# Altium footprint library Chestin_PcbLib.PcbLib: 203 footprints (part 7 of 13)
Each footprint in its own frame and in the unit in brackets; x right, y up, seen from the top. Pads: shape width x height; smd on the part's side, far side on the other; paste and mask are expansions set on the pad; w line width, h text height; cw(c..) or ccw(c..) is an arc to the next point about the centre after c.
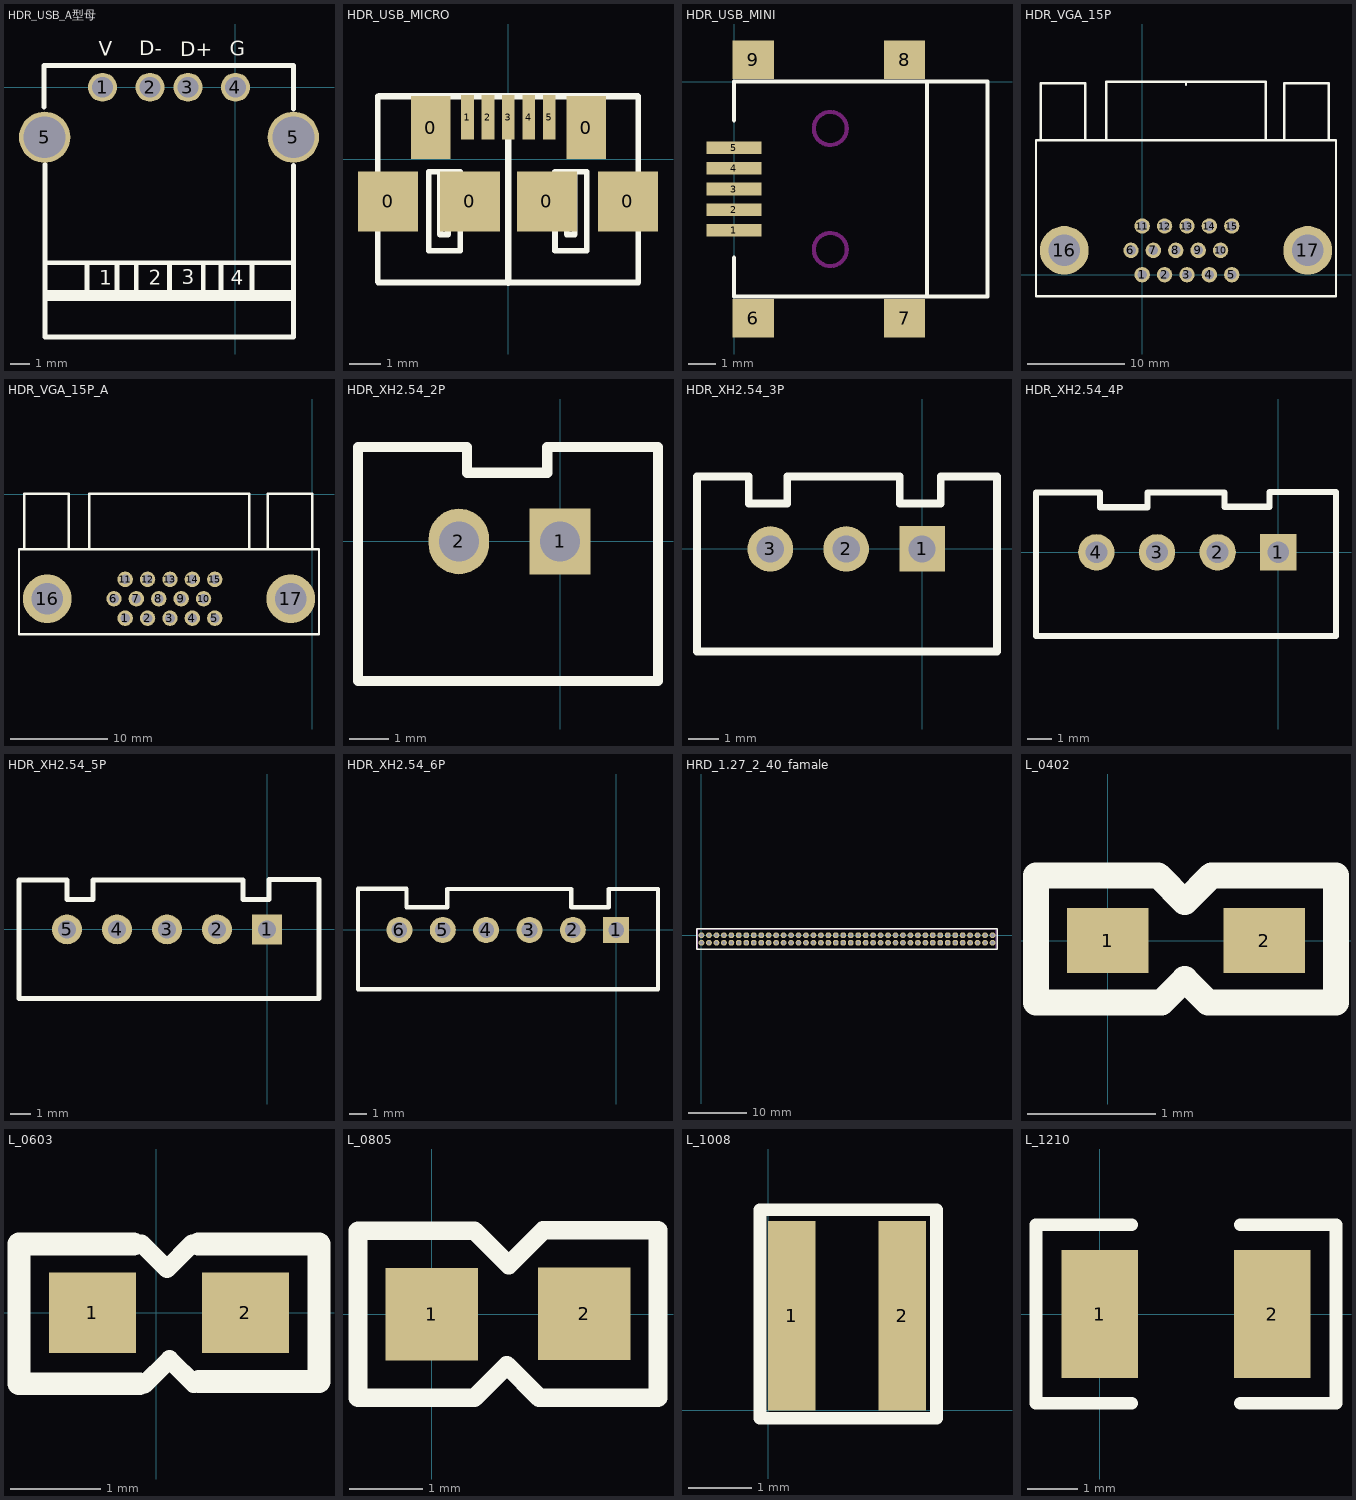
[diagram p6: the footprints below, top view; thin cyan lines are the x and y axes]

## HDR_USB_A型母 [mm]
pads (6):
  round 1.524 hole 1.1: 1(-7,0) 2(-4.5,0) 3(-2.5,0) 4(0,0)
  round 2.7 hole 2.2: 5(-10.05,-2.635) 5(3.05,-2.635)
Top Overlay:
  lines w0.254: -10.079,-1.041 -10.079,1.143 3.053,1.143 3.053,-1.143 3.053,0.356 ; -10.028,-9.246 3.053,-9.246 ; -10.028,-4.064 -10.028,-13.157 3.053,-13.157 3.053,-4.115 ; -10.002,-11.135 3.053,-11.135 ; -10.002,-10.922 3.053,-10.922 ; -9.875,-10.795 3.053,-10.795 ; -7.818,-10.795 -7.818,-9.246 ; -6.243,-10.795 -6.243,-9.322 ; -5.227,-10.82 -5.227,-9.271 ; -3.475,-10.795 -3.475,-9.322 ; -1.697,-10.897 -1.697,-9.271 ; -0.757,-10.871 -0.757,-9.271 ; 0.869,-10.998 0.869,-9.296
  text "V" at -7.188,1.651 h0.76
  text "G" at -0.305,1.651 h0.76
  text "1" at -7.163,-10.414 h0.76
  text "2" at -4.572,-10.414 h0.76
  text "3" at -2.819,-10.389 h0.76
  text "4" at -0.254,-10.414 h0.76
  text "D+" at -2.896,1.626 h0.76
  text "D-" at -5.08,1.676 h0.76
3D body "Samtec-USBR-A-S-S-O-TH.STEP": height 1.9, standoff -8.95, extent -11.202,-12.979 4.598,1.181

## HDR_USB_MICRO [mm]
pads (11):
  rect 1.9x1.9 smd: 0(-3.797,-1.333) 0(-1.206,-1.333) 0(1.232,-1.333) 0(3.797,-1.333)
  rect 1.25x2 smd: 0(-2.451,1.003) 0(2.476,1.003)
  rect 0.4x1.4 smd: 1(-1.283,1.333) 2(-0.635,1.333) 3(0.013,1.333) 4(0.66,1.333) 5(1.308,1.333)
Top Overlay:
  lines w0.178: -4.127,-3.873 -4.127,1.994 ; -4.102,-3.899 4.102,-3.899 ; -2.152,-0.394 -2.152,-2.379 -1.949,-2.379 -1.898,-2.379 -1.898,-0.394 ; 1.861,-0.394 1.861,-2.379 2.115,-2.379 2.115,-0.394 ; 4.127,-3.899 4.127,1.994 ; -2.513,-2.894 -2.513,-0.394 -1.513,-0.394 -1.513,-2.894 -2.513,-2.894 ; 1.487,-2.894 2.487,-2.894 2.487,-0.394 1.487,-0.394 1.487,-2.894
  lines w0.2: -4.077,1.994 4.102,1.994 ; 0.013,-3.91 0.013,1.968
3D body "MICRO USB.STEP": height 2.77, standoff -0.17, extent -4.1,-3.912 4.1,2.018

## HDR_USB_MINI [mm]
pads (9):
  rect 2x0.457 smd: 1(-0.014,-5.389) 2(-0.014,-4.639) 3(-0.014,-3.889) 4(-0.014,-3.139) 5(-0.014,-2.389)
  rect 1.5x1.4 smd: 6(0.686,-8.589) 7(6.186,-8.589) 8(6.186,0.811) 9(0.686,0.811)
Top Overlay:
  lines w0.15: -0.014,-6.389 -0.014,-7.789 6.586,-7.789 9.2,-7.789 9.2,0.011 6.586,0.011 -0.014,0.011 -0.014,-1.389 ; 7,-7.789 7,0.011
Keep-Out Layer:
  circle w0.15: c3.486,-1.689 r0.6
  circle w0.15: c3.486,-6.089 r0.6

## HDR_VGA_15P [mm]
pads (17):
  round 1.58 hole 1: 1(0,0) 2(2.3,0) 3(4.6,0) 4(6.9,0) 5(9.2,0) 6(-1.15,2.5) 7(1.15,2.5) 8(3.45,2.5) 9(5.75,2.5) 10(8.05,2.5) 11(0,5) 12(2.3,5) 13(4.6,5) 14(6.9,5) 15(9.2,5)
  round 5 hole 3.25: 16(-8,2.5) 17(17,2.5)
Top Overlay:
  lines w0.254: -10.9,-2.2 -10.9,13.8 19.9,13.8 19.9,-2.2 -10.89,-2.2 -10.9,-2.19 ; -10.4,13.8 -10.4,19.67 -5.83,19.67 -5.83,13.82 ; -3.7,13.8 -3.7,19.8 12.7,19.8 12.7,13.8 ; 4.5,19.5 4.5,19.8 ; 14.6,13.8 14.6,19.68 19.18,19.68 19.18,13.84
3D body "SW3dPS-Connector, D-Sub, 15 pin HD, RA, Receptacle.STEP": height 12.77, standoff -3.27, extent -11.055,-0.875 19.755,20.225

## HDR_VGA_15P_A [mm]
pads (17):
  round 1.58 hole 1: 1(-19.205,-12.725) 2(-16.905,-12.725) 3(-14.605,-12.725) 4(-12.305,-12.725) 5(-10.005,-12.725) 6(-20.355,-10.733) 7(-18.055,-10.733) 8(-15.755,-10.733) 9(-13.455,-10.733) 10(-11.155,-10.733) 11(-19.205,-8.741) 12(-16.905,-8.741) 13(-14.605,-8.741) 14(-12.305,-8.741) 15(-10.005,-8.741)
  round 5 hole 3.25: 16(-27.205,-10.733) 17(-2.205,-10.733)
Top Overlay:
  lines w0.254: -29.58,-5.664 -29.58,0.025 -25.01,0.025 -25.01,-5.664 ; -22.88,-5.588 -22.88,0.025 -6.48,0.025 -6.48,-5.664 ; -4.58,-5.639 -4.58,0.025 0,0.025 0,-5.639 ; -30.105,-14.354 0.695,-14.354 0.695,-5.664 -30.105,-5.664 -30.105,-14.354
3D body "User Library-SLIM D-SUB RIGHT ANGLE PCB MOUNT.step": height 10.25, standoff -3.09, extent -30.008,-13.801 0.792,-0.331

## HDR_XH2.54_2P [mil]
pads (2):
  rect 60x65 hole 39.37: 1(0,0)
  oval 60x65 hole 39.37: 2(-100.1,0)
Top Overlay:
  lines w10: -200,-138 97,-138 97,93.3 66.2,93.3 -12.6,93.3 -12.6,68 -92.1,68 -92.1,93.3 -200,93.3 -200,-138
3D body "sip2_n.stp": height 275.59, standoff -118.11, extent -197.64,-142.11 97.64,94.11

## HDR_XH2.54_3P [mm]
pads (3):
  rect 1.5x1.5 hole 0.9: 1(0,0)
  round 1.5 hole 0.9: 2(-2.5,0) 3(-5,0)
Top Overlay:
  lines w0.254: -7.413,-3.378 -7.413,2.388 -5.711,2.388 -5.711,1.5 -4.441,1.5 -4.441,2.388 -0.733,2.388 -0.733,1.5 0.613,1.5 0.613,2.388 2.468,2.388 2.468,-3.378 -7.413,-3.378
3D body "3pin-2.5.step": height 7, standoff -3.4, extent -7.41,-3.408 2.49,2.342

## HDR_XH2.54_4P [mm]
pads (4):
  rect 1.5x1.5 hole 0.9: 1(0,0)
  round 1.5 hole 0.9: 2(-2.5,0) 3(-5,0) 4(-7.5,0)
Top Overlay:
  lines w0.254: -9.989,-3.454 2.381,-3.454 2.381,2.489 -0.363,2.489 -0.363,1.88 -2.217,1.88 -2.217,2.464 -5.392,2.464 -5.392,1.854 -7.348,1.854 -7.348,2.464 -9.989,2.464 -9.989,-3.454
3D body "4pin-2.5.step": height 7, standoff -3.4, extent -9.966,-3.383 2.434,2.367

## HDR_XH2.54_5P [mm]
pads (5):
  rect 1.5x1.5 hole 0.9: 1(0,0)
  round 1.5 hole 0.9: 2(-2.5,0) 3(-5,0) 4(-7.5,0) 5(-10,0)
Top Overlay:
  lines w0.254: -8.7,2.438 -8.7,1.5 -10,1.5 -10,2.464 -12.4,2.464 -12.4,-3.454 2.6,-3.454 2.6,2.489 0.1,2.489 0.1,1.5 -1.2,1.5 -1.2,2.464 -8.7,2.464
3D body "User Library-jst-b5b-xh-a.STEP": height 7, standoff -3.4, extent -12.511,-3.388 2.519,2.362

## HDR_XH2.54_6P [mm]
pads (6):
  rect 1.5x1.5 hole 0.9: 1(0,0)
  round 1.5 hole 0.9: 2(-2.5,0) 3(-5,0) 4(-7.5,0) 5(-10,0) 6(-12.5,0)
Top Overlay:
  lines w0.254: -14.888,-3.429 2.41,-3.429 2.41,2.362 -0.435,2.362 -0.435,1.321 -2.594,1.321 -2.594,2.362 -9.731,2.362 -9.731,1.321 -12.094,1.321 -12.094,2.388 -14.888,2.388 -14.888,-3.429
3D body "6pin-2.5.step": height 7, standoff -3.4, extent -14.977,-3.383 2.423,2.367

## HRD_1.27_2_40_famale [mm]
pads (80):
  round 1 hole 0.61 mask+0.051: 1(0,-1.27) 2(0,0) 3(1.27,-1.27) 4(1.27,0) 5(2.54,-1.27) 6(2.54,0) 7(3.81,-1.27) 8(3.81,0) 9(5.08,-1.27) 10(5.08,0) 11(6.35,-1.27) 12(6.35,0) 13(7.62,-1.27) 14(7.62,0) 15(8.89,-1.27) 16(8.89,0) 17(10.16,-1.27) 18(10.16,0) 19(11.43,-1.27) 20(11.43,0) 21(12.7,-1.27) 22(12.7,0) 23(13.97,-1.27) 24(13.97,0) 25(15.24,-1.27) 26(15.24,0) 27(16.51,-1.27) 28(16.51,0) 29(17.78,-1.27) 30(17.78,0) 31(19.05,-1.27) 32(19.05,0) 33(20.32,-1.27) 34(20.32,0) 35(21.59,-1.27) 36(21.59,0) 37(22.86,-1.27) 38(22.86,0) 39(24.13,-1.27) 40(24.13,0) 41(25.4,-1.27) 42(25.4,0) 43(26.67,-1.27) 44(26.67,0) 45(27.94,-1.27) 46(27.94,0) 47(29.21,-1.27) 48(29.21,0) 49(30.48,-1.27) 50(30.48,0) 51(31.75,-1.27) 52(31.75,0) 53(33.02,-1.27) 54(33.02,0) 55(34.29,-1.27) 56(34.29,0) 57(35.56,-1.27) 58(35.56,0) 59(36.83,-1.27) 60(36.83,0) 61(38.1,-1.27) 62(38.1,0) 63(39.37,-1.27) 64(39.37,0) 65(40.64,-1.27) 66(40.64,0) 67(41.91,-1.27) 68(41.91,0) 69(43.18,-1.27) 70(43.18,0) 71(44.45,-1.27) 72(44.45,0) 73(45.72,-1.27) 74(45.72,0) 75(46.99,-1.27) 76(46.99,0) 77(48.26,-1.27) 78(48.26,0) 79(49.53,-1.27) 80(49.53,0)
Top Overlay:
  lines w0.254: -0.762,-2.413 50.292,-2.413 50.292,1.143 -0.762,1.143 -0.762,-2.413
Mechanical 15:
  drawing of 85 lines, arcs and shapes, not listed

## L_0402 [mil]
pads (2):
  rect 25x20 smd: 1(0,0) 2(48,0)
Top Overlay:
  lines w8: -22,-19 16.43,-19 23.62,-11.81 30.81,-19 70,-19 70,20 31.81,20 23.62,11.81 15.43,20 -22,20 -22,-19
3D body: height 10, standoff 0, extent 8,-10 41,10
3D body: height 10, standoff 0, extent 5,-10 8,10
3D body: height 10, standoff 0, extent 41,-10 44,10

## L_0603 [mil]
pads (2):
  rect 38x35 smd: 1(-28,0) 2(38.87,0)
Top Overlay:
  lines w8: -6.53,30.27 4.6,19.14 15.58,30.12 ; -5.3,-31.36 5.7,-20.36 16.32,-30.98
  lines w10: -9.9,30 -60,30 -60,-31 -7.3,-31 ; 18.4,30 71,30 71,-30 18.6,-30
3D body: height 20, standoff 0, extent -16,-15 28,15
3D body: height 20, standoff 0, extent 28,-15 36,15
3D body: height 20, standoff 0, extent -24,-15 -16,15

## L_0805 [mm]
pads (2):
  rect 1.27x1.27 smd: 1(0,0) 2(2.09,0.005)
Top Overlay:
  lines w0.254: -1.011,-1.143 0.584,-1.143 1.029,-0.699 1.473,-1.143 3.099,-1.143 3.099,1.148 1.529,1.148 1.054,0.673 0.584,1.143 -1.011,1.143 -1.011,-1.143
3D body "R0805.STEP": height 0.55, standoff 0, extent 0.036,-0.62 2.036,0.64

## L_1008 [mm] "LQH2H系列"
pads (2):
  rect 0.75x3 smd: 1(0.375,1.5) 2(2.125,1.5)
Top Overlay:
  lines w0.203: -0.127,-0.127 -0.127,3.175 2.667,3.175 2.667,-0.127 -0.127,-0.127

## L_1210 [mil]
pads (2):
  rect 60x100 smd: 1(0,0) 2(135,0)
Top Overlay:
  lines w10: 25,-70 -50,-70 -50,70 25,70 ; 110,-70 185,-70 185,70 110,70
3D body "L1210.STEP": height 78.74, standoff 0, extent 7.09,-51.96 131.11,46.48